# Altium schematic symbol library Electronic Devices_LIB.SchLib: 703 symbols (part 8 of 8) (continued)
## TRANS_BIPOLAR_NPN_BC847BDW1T1G (continued)
ON Semi BC847BDW1T1G Dual NPN Bipolar Transistor; 0.1 A; 45 V; 6-Pin SC-88; Manufacturer: ON Semiconductor; Max Power Dissipation: 380mW; Max Collector Current: 100mA; Collector Base Voltage (VCBO): 50V; Transition Frequency: 100MHz; Collector Emitter Breakdown Voltage: 45V; Collector-emitter Voltage-Max: 600mV; hFE Min: 200; Emitter Base Voltage (VEBO): 6V; Number of Elements: 2; Supplier 1: Digikey; Manufacturer Part Number: BC847BDW1T1G; RoHS: Yes; Category: BJTs; Stock 1: 35041; Pricing 1: 1=0.22, 10=0.149, 100=0.0729, 500=0.06078, 1000=0.04224 (USD); Case/Package: SOT-363-6; Number of Pins: 6; Contact Plating: Tin,Matte; Min Operating Temperature: -55°C; Max Operating Temperature: 150°C; Package Quantity: 3000; Packaging: Tape and Reel; Max Breakdown Voltage: 45V; Polarity: NPN; Series: -; Collector Emitter Voltage (VCEO): 45V; Collector Emitter Saturation Voltage: 600mV; Power Dissipation: 380mW; Max Frequency: 100MHz; Gain Bandwidth Product: 100MHz; Frequency: 100MHz; Voltage Rating (DC): 45V; Current Rating: 100mA; Length: 2mm; Width: 1.25mm; Height: 0.9mm; Radiation Hardening: No; RoHS Compliant: Yes; Lead Free: Lead Free; Halogen Free: Halogen Free; Reach SVHC Compliant: No; ComponentLink1URL: https://datasheet.ciiva.com/15138/getdatasheetpartid-32925-15138586.pdf?src-supplier=Verical; ComponentLink1Description: https://datasheet.ciiva.com/15138/getdatasheetpartid-32925-15138586.pdf?src-supplier=Verical; ComponentLink2URL: https://datasheet.ciiva.com/34303/2012187-34303831.pdf?src-supplier=Jameco; ComponentLink2Description: https://datasheet.ciiva.com/34303/2012187-34303831.pdf?src-supplier=Jameco; ComponentLink3URL: https://datasheet.ciiva.com/968/bc846bdw1t1-d-968805.pdf?src-supplier=Digikey; ComponentLink3Description: https://datasheet.ciiva.com/968/bc846bdw1t1-d-968805.pdf?src-supplier=Digikey; ComponentLink4URL: https://datasheet.ciiva.com/968/bc846bdw1t1-d-968806.pdf?src-supplier=Digikey; ComponentLink4Description: https://datasheet.ciiva.com/968/bc846bdw1t1-d-968806.pdf?src-supplier=Digikey; ComponentLink5URL: https://datasheet.ciiva.com/968/bc846bdw1t1-d-968807.pdf?src-supplier=Digikey; ComponentLink5Description: https://datasheet.ciiva.com/968/bc846bdw1t1-d-968807.pdf?src-supplier=Digikey; ComponentLink6URL: https://datasheet.ciiva.com/1215/bc846bdw1t1-d-1215105.pdf?src-supplier=Farnell; ComponentLink6Description: https://datasheet.ciiva.com/1215/bc846bdw1t1-d-1215105.pdf?src-supplier=Farnell; ComponentLink7URL: https://datasheet.ciiva.com/22653/1708249-22653900.pdf?src-supplier=Element14; ComponentLink7Description: https://datasheet.ciiva.com/22653/1708249-22653900.pdf?src-supplier=Element14; ComponentLink8URL: https://datasheet.ciiva.com/16201/bc846bdw1t1-d-16201675.pdf?src-supplier=Future+Electronics; ComponentLink8Description: https://datasheet.ciiva.com/16201/bc846bdw1t1-d-16201675.pdf?src-supplier=Future+Electronics; Supplier Part Number 1: BC847BDW1T1GOSCT-ND
footprint TRANS_BJT_SOT65P210X110-6N
part A pins: 3 COLLECTOR_1, 4 EMITTER_1, 5 BASE_1
part B pins: 1 EMITTER_2, 2 BASE_2, 6 COLLECTOR_2

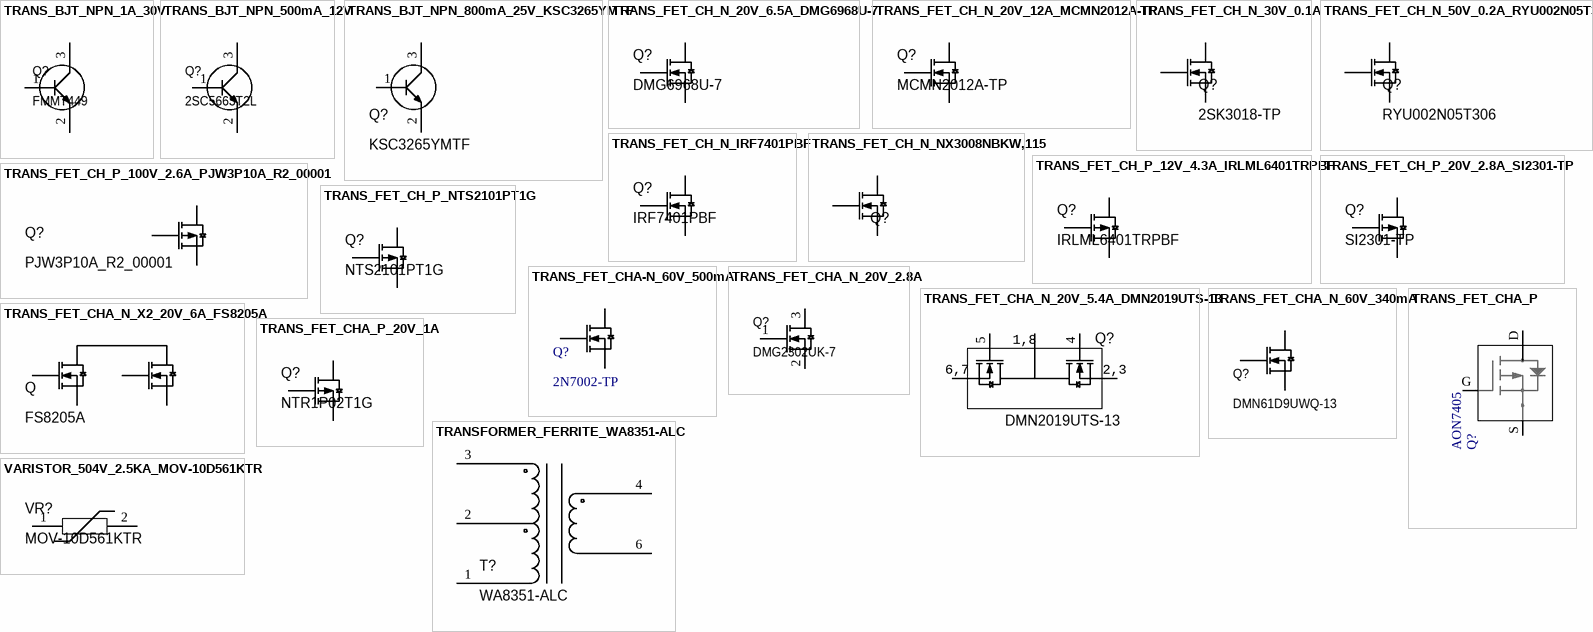
[diagram p36: symbols TRANS_BJT_NPN_1A_30V to VARISTOR_504V_2.5KA_MOV-10D561KTR]

## TRANS_BJT_NPN_1A_30V
designator Q?, comment FMMT449
FMMT Series NPN 500 mW 30 V 1 A Surface Mount Small Signal Transistor - SOT-23; Manufacturer: ON Semiconductor / Fairchild; Max Power Dissipation: 500mW; Max Collector Current: 1A; Collector Base Voltage (VCBO): 50V; Transition Frequency: 150MHz; Collector Emitter Breakdown Voltage: 30V; Emitter Base Voltage (VEBO): 5V; Collector-emitter Voltage-Max: 1V; Number of Elements: 1; hFE Min: 100; Supplier 1: Avnet; Manufacturer Part Number: FMMT449; RoHS: Yes; Category: Uncategorized; Stock 1: 12000; Pricing 1: 4007=0.09235, 4100=0.08986, 8100=0.08736, 21000=0.08486, 41000=0.08237, 210000=0.07987, 410000=0.07738 (USD); Mount: Surface Mount; Case/Package: SOT-323; Number of Pins: 3; Weight: 0.03g; Min Operating Temperature: -55°C; Max Operating Temperature: 150°C; Packaging: Tape and Reel; Package Quantity: 3000; Series: -; Current Rating: 1A; Voltage Rating (DC): 30V; Collector Emitter Voltage (VCEO): 30V; Max Breakdown Voltage: 30V; Polarity: NPN; Gain Bandwidth Product: 150MHz; Max Frequency: 150MHz; Frequency: 150MHz; Collector Emitter Saturation Voltage: 1V; Power Dissipation: 500mW; Length: 2.92mm; Width: 1.4mm; Height: 0.94mm; Radiation Hardening: No; RoHS Compliant: Yes; Lead Free: Lead Free; ComponentLink1URL: https://datasheet.ciiva.com/4722/fmmt449-111706-4722204.pdf?src-supplier=Mouser; ComponentLink1Description: https://datasheet.ciiva.com/4722/fmmt449-111706-4722204.pdf?src-supplier=Mouser; ComponentLink2URL: https://datasheet.ciiva.com/6360/fmmt449-6360756.pdf?src-supplier=Digi-Key; ComponentLink2Description: https://datasheet.ciiva.com/6360/fmmt449-6360756.pdf?src-supplier=Digi-Key; ComponentLink3URL: https://datasheet.ciiva.com/6360/fmmt449-6360759.pdf?src-supplier=Digi-Key; ComponentLink3Description: https://datasheet.ciiva.com/6360/fmmt449-6360759.pdf?src-supplier=Digi-Key; ComponentLink4URL: https://datasheet.ciiva.com/6360/fmmt449-6360760.pdf?src-supplier=Digi-Key; ComponentLink4Description: https://datasheet.ciiva.com/6360/fmmt449-6360760.pdf?src-supplier=Digi-Key; Supplier Part Number 1: FMMT449
footprint SOT_23_3_MMBT2907A-13 (SOT-23-3)
pins: 1 B, 2 E, 3 C

## TRANS_BJT_NPN_500mA_12V
designator Q?, comment 2SC5663T2L
2SC5663 Series 12 V 0.5 A SMT NPN Low Frequency Transistor - VMT-3; Manufacturer: Rohm; Collector Emitter Voltage (VCEO): 12V; Max Power Dissipation: 150mW; hFE Min: 270; Max Collector Current: 500mA; Transition Frequency: 320MHz; Collector Base Voltage (VCBO): 15V; Emitter Base Voltage (VEBO): 6V; Collector Emitter Saturation Voltage: 90mV; Collector-emitter Voltage-Max: 250mV; Supplier 1: Digi-Key; Manufacturer Part Number: 2SC5663T2L; RoHS: Yes; Category: BJTs; Stock 1: 46680; Pricing 1: 1=0.53, 10=0.43, 100=0.2929, 500=0.21964, 1000=0.16474, 2000=0.15101 (USD); Mount: Surface Mount; Case/Package: SOT-723; Number of Pins: 3; Contact Plating: Copper,Tin; Min Operating Temperature: -55°C; Max Operating Temperature: 150°C; Package Quantity: 1; Packaging: Tape and Reel; Collector Emitter Breakdown Voltage: 12V; Polarity: NPN; Continuous Collector Current: 500mA; Max Breakdown Voltage: 12V; Gain Bandwidth Product: 320MHz; Voltage Rating (DC): 12V; Power Dissipation: 150mW; Current Rating: 500mA; Series: -; Radiation Hardening: No; Reach SVHC Compliant: No; Lead Free: Lead Free; RoHS Compliant: Yes; ComponentLink1URL: https://datasheet.ciiva.com/6361/2sc5585-6361793.pdf?src-supplier=Digi-Key; ComponentLink1Description: https://datasheet.ciiva.com/6361/2sc5585-6361793.pdf?src-supplier=Digi-Key; ComponentLink2URL: https://datasheet.ciiva.com/16307/2sc5585-16307766.pdf?src-supplier=Future+Electronics; ComponentLink2Description: https://datasheet.ciiva.com/16307/2sc5585-16307766.pdf?src-supplier=Future+Electronics; ComponentLink3URL: https://datasheet.ciiva.com/1194/1641603-1194870.pdf?src-supplier=Element14; ComponentLink3Description: https://datasheet.ciiva.com/1194/1641603-1194870.pdf?src-supplier=Element14; Supplier Part Number 1: 2SC5663T2LCT-ND; Supplier 2: Digi-Key; Supplier Part Number 2: 311-261HRCT-ND
footprint TRANS_BJT_2SC5663T2L (SOT-723)
pins: 1 B, 2 E, 3 C

## TRANS_BJT_NPN_800mA_25V_KSC3265YMTF
designator Q?, comment KSC3265YMTF
KSC3265 Series 25 V CE Breakdown .8 A NPN Epitaxial Silicon Transistor - SOT-23; Manufacturer: ON Semiconductor / Fairchild; Max Power Dissipation: 200mW; hFE Min: 100; Max Collector Current: 800mA; Collector Base Voltage (VCBO): 30V; Emitter Base Voltage (VEBO): 5V; Gain Bandwidth Product: 120MHz; Collector-emitter Voltage-Max: 400mV; Collector Emitter Voltage (VCEO): 25V; Number of Elements: 1; Supplier 1: Digikey; Manufacturer Part Number: KSC3265YMTF; RoHS: Yes; Category: BJTs; Stock 1: 8859; Pricing 1: 1=0.22, 10=0.132, 100=0.0817, 500=0.05974, 1000=0.0526, 3000=0.0435, 6000=0.0389, 9000=0.03655, 15000=0.0339, 21000=0.03233, 30000=0.0308, 75000=0.02745, 150000=0.02537, 300000=0.02363 (USD); Mount: Surface Mount; Case/Package: SOT-23; Number of Pins: 3; Weight: 0.03g; Min Operating Temperature: -55°C; Max Operating Temperature: 150°C; Package Quantity: 3000; Packaging: Tape and Reel; Polarity: NPN; Series: -; Frequency: 120MHz; Transition Frequency: 120MHz; Collector Emitter Breakdown Voltage: 25V; Max Breakdown Voltage: 25V; Collector Emitter Saturation Voltage: 400mV; Power Dissipation: 200mW; Max Frequency: 120MHz; Voltage Rating (DC): 25V; Current Rating: 800mA; Length: 2.9mm; Width: 1.3mm; Height: 0.97mm; Radiation Hardening: No; Reach SVHC Compliant: No; Lead Free: Lead Free; RoHS Compliant: Yes; ComponentLink1URL: https://datasheet.ciiva.com/15138/getdatasheetpartid-30747-15138569.pdf?src-supplier=Verical; ComponentLink1Description: https://datasheet.ciiva.com/15138/getdatasheetpartid-30747-15138569.pdf?src-supplier=Verical; ComponentLink2URL: https://datasheet.ciiva.com/6356/ksc3265-6356136.pdf?src-supplier=Digikey; ComponentLink2Description: https://datasheet.ciiva.com/6356/ksc3265-6356136.pdf?src-supplier=Digikey; ComponentLink3URL: https://datasheet.ciiva.com/6356/ksc3265-6356138.pdf?src-supplier=Digikey; ComponentLink3Description: https://datasheet.ciiva.com/6356/ksc3265-6356138.pdf?src-supplier=Digikey; ComponentLink4URL: https://datasheet.ciiva.com/6356/ksc3265-6356141.pdf?src-supplier=Digikey; ComponentLink4Description: https://datasheet.ciiva.com/6356/ksc3265-6356141.pdf?src-supplier=Digikey; Supplier Part Number 1: KSC3265YMTFCT-ND
footprint TRANS_BJT_SOT96P237X111-3N
pins: 1 B, 2 E, 3 C

## TRANS_FET_CH_N_20V_6.5A_DMG6968U-7
designator Q?, comment DMG6968U-7
Trans Mosfet N-ch 20V 6.5A 3-PIN SOT-23 T/r Trans Mosfet N-ch 20V 6.5A 3-PIN SOT-23 T/r; Manufacturer: Diodes; Rise Time: 66ns; Turn-Off Delay Time: 613ns; Turn-On Delay Time: 54ns; Fall Time: 205ns; Gate to Source Voltage (Vgs): 12V; Polarity: N-CHANNEL; Nominal Vgs: 500mV; Input Capacitance: 151pF; Max Power Dissipation: 1.3W; Rds On Max: 25mR; Number of Channels: 1; Drain-source On Resistance-Max: 36mR; Supplier 1: Digikey; Manufacturer Part Number: DMG6968U-7; RoHS: Yes; Category: MOSFETs; Stock 1: 575891; Pricing 1: 1=0.37, 10=0.289, 100=0.1732, 500=0.16034, 1000=0.10903 (USD); Mount: Surface Mount; Case/Package: SOT-23-3; Number of Pins: 3; Weight: 0.000282oz; Min Operating Temperature: -55°C; Max Operating Temperature: 150°C; Packaging: Tape and Reel; Package Quantity: 1; Continuous Drain Current (ID): 6.5A; Series: -; Drain to Source Voltage (Vdss): 20V; Drain to Source Resistance: 25mR; Threshold Voltage: 500mV; Length: 2.9mm; Width: 1.3mm; Height: 1mm; Radiation Hardening: No; Reach SVHC Compliant: No; Lead Free: Lead Free; RoHS Compliant: Yes; ComponentLink1URL: https://datasheet.ciiva.com/5774/ds31738-5774992.pdf?src-supplier=Farnell; ComponentLink1Description: https://datasheet.ciiva.com/5774/ds31738-5774992.pdf?src-supplier=Farnell; ComponentLink2URL: https://datasheet.ciiva.com/22712/1915638-22712395.pdf?src-supplier=Element14; ComponentLink2Description: https://datasheet.ciiva.com/22712/1915638-22712395.pdf?src-supplier=Element14; Supplier Part Number 1: DMG6968UDICT-ND
footprint SOT_23_3_MMBT2907A-13 (SOT-23-3)
pins: 1 G, 2 S, 3 D

## TRANS_FET_CH_N_20V_12A_MCMN2012A-TP
designator Q?, comment MCMN2012A-TP
N-channel Mosfet; Manufacturer: MCC; Supplier 1: Digikey; Manufacturer Part Number: MCMN2012A-TP; RoHS: No; Category: Uncategorized; Stock 1: 17562; Pricing 1: 1=0.44, 10=0.378, 100=0.2626, 500=0.20504, 1000=0.16665 (USD); Supplier Part Number 1: 353-MCMN2012A-TPDKR-ND
footprint TRANS_FET_DFN2020-6JA (DFN2020)
pins: D, G, S

## TRANS_FET_CH_N_30V_0.1A
designator Q?, comment 2SK3018-TP
Trans Mosfet N-ch 30V 0.1A 3-PIN SOT-323 T/r; Manufacturer: MCC; Continuous Drain Current (ID): 100mA; Rds On Max: 8R; Input Capacitance: 13pF; Max Power Dissipation: 200mW; Supplier 1: Digi-Key; Manufacturer Part Number: 2SK3018-TP; RoHS: Yes; Stock 1: 57538; Pricing 1: 1=0.41, 10=0.289, 100=0.1458, 500=0.11898, 1000=0.08827 (USD); Mount: Surface Mount; Case/Package: SOT-323; Min Operating Temperature: -55°C; Max Operating Temperature: 150°C; Packaging: Cut Tape; Drain to Source Voltage (Vdss): 30V; Series: -; RoHS Compliant: Yes; ComponentLink1URL: http://www.mccsemi.com/up_pdf/2SK3018(SOT-323).pdf?src-supplier=Digi-Key; ComponentLink1Description: http://www.mccsemi.com/up_pdf/2SK3018(SOT-323).pdf?src-supplier=Digi-Key; Supplier Part Number 1: 2SK3018-TPMSCT-ND
footprint SOT-323 (SC-70, SOT-323)
pins: D, G, S

## TRANS_FET_CH_N_50V_0.2A_RYU002N05T306
designator Q?, comment RYU002N05T306
Trans MOSFET N-CH Si 50V 0.2A 3-Pin UMT T/R; Manufacturer: Rohm; Continuous Drain Current (ID): 200mA; Supplier 1: Verical; Manufacturer Part Number: RYU002N05T306; RoHS: Yes; Category: MOSFETs; Stock 1: 3000; Pricing 1: 705=0.1073, 1000=0.1038, 2500=0.1007 (USD); Drain to Source Voltage (Vdss): 50V; Lead Free: Lead Free; RoHS Compliant: Yes; Supplier Part Number 1: RYU002N05T306
footprint SOT-323 (SC-70, SOT-323)
pins: D, G, S

## TRANS_FET_CH_N_IRF7401PBF
designator Q?, comment IRF7401PBF
IRF7401PBF N-channel MOSFET Transistor; 8.7 A; 20 V; 8-Pin SOIC; Manufacturer: International Rectifier; Continuous Drain Current (ID): 8.7A; Max Power Dissipation: 2.5W; Drain to Source Voltage (Vdss): 20V; Gate to Source Voltage (Vgs): 12V; Turn-Off Delay Time: 65ns; Turn-On Delay Time: 13ns; Input Capacitance: 1.6nF; Rise Time: 72ns; Number of Elements: 1; Fall Time: 92ns; Threshold Voltage: 700mV; Drain-source On Resistance-Max: 22mR; Supplier 1: Digikey; Manufacturer Part Number: IRF7401PBF; RoHS: Yes; Category: Uncategorized; Mount: Surface Mount; Case/Package: SOIC; Number of Pins: 8; Min Operating Temperature: -55°C; Max Operating Temperature: 150°C; Power Dissipation: 2.5W; Voltage Rating (DC): 20V; Current Rating: 8.7A; Length: 5mm; Width: 4mm; Height: 1.5mm; Lead Free: Lead Free; RoHS Compliant: Yes; Reach SVHC Compliant: No; ComponentLink1URL: https://datasheet.ciiva.com/6368/irf7401pbf-6368096.pdf?src-supplier=Digikey; ComponentLink1Description: https://datasheet.ciiva.com/6368/irf7401pbf-6368096.pdf?src-supplier=Digikey; ComponentLink2URL: https://datasheet.ciiva.com/19479/1560843-19479950.pdf?src-supplier=Jameco; ComponentLink2Description: https://datasheet.ciiva.com/19479/1560843-19479950.pdf?src-supplier=Jameco; ComponentLink3URL: https://datasheet.ciiva.com/7935/irf7401pbf-7935735.pdf?src-supplier=Element14; ComponentLink3Description: https://datasheet.ciiva.com/7935/irf7401pbf-7935735.pdf?src-supplier=Element14; ComponentLink4URL: https://datasheet.ciiva.com/16379/irf7401pbf-16379769.pdf?src-supplier=Future+Electronics; ComponentLink4Description: https://datasheet.ciiva.com/16379/irf7401pbf-16379769.pdf?src-supplier=Future+Electronics; Supplier Part Number 1: 2156-IRF7401PBF-ND
footprint FET_IRF_SOIC127P600X175-8N
simulation model irf7401 (Model Description)
pins: D, G, S

## TRANS_FET_CH_N_NX3008NBKW,115
designator Q?, comment NX3008NBKW,115  (value not drawn)
Trans MOSFET N-CH 30V 0.35A Automotive 3-Pin SC-70 T/R; Manufacturer: Nexperia; Rise Time: 11ns; Turn-Off Delay Time: 69ns; Turn-On Delay Time: 15ns; Supplier 1: Digikey; Manufacturer Part Number: NX3008NBKW,115; RoHS: Yes; Category: MOSFETs; Stock 1: 784274; Pricing 1: 1=0.35, 10=0.239, 100=0.1169, 500=0.09748, 1000=0.06774 (USD); RoHS Compliant: Yes; ComponentLink1URL: https://www.mouser.com/ds/2/302/NX3008NBKW-1151440.pdf?src-supplier=Mouser; ComponentLink1Description: https://www.mouser.com/ds/2/302/NX3008NBKW-1151440.pdf?src-supplier=Mouser; ComponentLink2URL: http://www.farnell.com/datasheets/1508392.pdf?src-supplier=Farnell; ComponentLink2Description: http://www.farnell.com/datasheets/1508392.pdf?src-supplier=Farnell; ComponentLink3URL: https://assets.nexperia.com/documents/data-sheet/NX3008NBKW.pdf?src-supplier=Digikey; ComponentLink3Description: https://assets.nexperia.com/documents/data-sheet/NX3008NBKW.pdf?src-supplier=Digikey; ComponentLink4URL: https://datasheet.octopart.com/NX3008NBKW%2C115-Nexperia-datasheet-87581391.pdf?src-supplier=LKR; ComponentLink4Description: https://datasheet.octopart.com/NX3008NBKW%2C115-Nexperia-datasheet-87581391.pdf?src-supplier=LKR; ComponentLink5URL: https://datasheet.octopart.com/NX3008NBKW%2C115-Nexperia-datasheet-154583516.pdf?src-supplier=TME; ComponentLink5Description: https://datasheet.octopart.com/NX3008NBKW%2C115-Nexperia-datasheet-154583516.pdf?src-supplier=TME; Supplier Part Number 1: 1727-1280-1-ND
footprint TRANS_FET_SOT65P210X110-3N (SC-70, SOT-323)
pins: D, G, S

## TRANS_FET_CH_P_12V_4.3A_IRLML6401TRPBF
designator Q?, comment IRLML6401TRPBF
Mosfet, Power; P-ch; Vdss -12V; Rds(on) 0.05 Ohm; Id -4.3A; MICRO3; Pd 1.3W; Vgs +/-8V; Manufacturer: Infineon; Continuous Drain Current (ID): 4.3A; Input Capacitance: 830pF; Rds On Max: 50mR; Nominal Vgs: -550mV; Number of Channels: 1; Fall Time: 210ns; Supplier 1: Mouser; Manufacturer Part Number: IRLML6401TRPBF; RoHS: Yes; Category: MOSFETs; Stock 1: 257081; Pricing 1: 1=0.47, 10=0.259, 50=0.259, 100=0.161, 1000=0.144, 10000=0.088 (USD); Mount: Surface Mount; Case/Package: SOT-23; Number of Pins: 3; Min Operating Temperature: -55°C; Max Operating Temperature: 150°C; Drain to Source Voltage (Vdss): -12V; Packaging: Cut Tape; Max Power Dissipation: 1.3W; Series: HEXFET®; Dual Supply Voltage: -12V; Threshold Voltage: -550mV; Max Dual Supply Voltage: -12V; Current Rating: -4.3A; Package Quantity: 3000; Resistance: 50mR; Voltage Rating (DC): -12V; Number of Elements: 1; On-State Resistance: 50mR; Termination: SMD/SMT; Radiation Hardening: No; RoHS Compliant: Yes; Lead Free: Lead Free; Reach SVHC Compliant: No; Halogen Free: Halogen Free; ComponentLink1URL: http://www.farnell.com/datasheets/1912227.pdf?src-supplier=Farnell; ComponentLink1Description: http://www.farnell.com/datasheets/1912227.pdf?src-supplier=Farnell; ComponentLink2URL: https://www.infineon.com/dgdl/irlml6401pbf.pdf?fileId=5546d462533600a401535668b96d2634&src-supplier=Digikey; ComponentLink2Description: https://www.infineon.com/dgdl/irlml6401pbf.pdf?fileId=5546d462533600a401535668b96d2634&src-supplier=Digikey; ComponentLink3URL: http://datasheet.octopart.com/IRLML6401TRPBF-International-Rectifier-datasheet-66727.pdf?src-supplier=Future+Electronics; ComponentLink3Description: http://datasheet.octopart.com/IRLML6401TRPBF-International-Rectifier-datasheet-66727.pdf?src-supplier=Future+Electronics; ComponentLink4URL: http://www.farnell.com/datasheets/1912227.pdf?src-supplier=Newark; ComponentLink4Description: http://www.farnell.com/datasheets/1912227.pdf?src-supplier=Newark; ComponentLink5URL: https://datasheet.octopart.com/IRLML6401TRPBF-Infineon-datasheet-41193306.pdf?src-supplier=Newark; ComponentLink5Description: https://datasheet.octopart.com/IRLML6401TRPBF-Infineon-datasheet-41193306.pdf?src-supplier=Newark; ComponentLink6URL: http://datasheet.octopart.com/IRLML6401TRPBF-International-Rectifier-datasheet-66727.pdf?src-supplier=Rs; ComponentLink6Description: http://datasheet.octopart.com/IRLML6401TRPBF-International-Rectifier-datasheet-66727.pdf?src-supplier=Rs; ComponentLink7URL: http://www.farnell.com/datasheets/1912227.pdf?src-supplier=Element14; ComponentLink7Description: http://www.farnell.com/datasheets/1912227.pdf?src-supplier=Element14; ComponentLink8URL: https://datasheet.octopart.com/IRLML6401TRPBF-International-Rectifier-datasheet-10898914.pdf?src-supplier=Element14; ComponentLink8Description: https://datasheet.octopart.com/IRLML6401TRPBF-International-Rectifier-datasheet-10898914.pdf?src-supplier=Element14; Supplier Part Number 1: 942-IRLML6401TRPBF
footprint TRANS_FET_CH_P_SOT95P237X125-3N
pins: 1 G, 2 S, 3 D

## TRANS_FET_CH_P_20V_2.8A_SI2301-TP
designator Q?, comment SI2301-TP
SI2301 Series 20 V 120 mOhm SMT P-Channel Field Effect Transistor - SOT-23-3; Manufacturer: MCC; Rds On Max: 120mR; Input Capacitance: 880pF; Drain to Source Voltage (Vdss): 20V; Continuous Drain Current (ID): 2.8A; Max Power Dissipation: 1.25W; Drain to Source Resistance: 110mR; Number of Elements: 1; Drain to Source Breakdown Voltage: -20V; Gate to Source Voltage (Vgs): 8V; Supplier 1: Digikey; Manufacturer Part Number: SI2301-TP; RoHS: Yes; Category: MOSFETs; Stock 1: 56093; Pricing 1: 1=0.45, 10=0.277, 100=0.175, 500=0.13082, 1000=0.11655, 3000=0.09838, 6000=0.08922, 9000=0.08454, 15000=0.07929, 21000=0.07618, 30000=0.07316, 75000=0.06652, 150000=0.06563 (USD); Mount: Surface Mount; Case/Package: SOT-23; Number of Pins: 3; Min Operating Temperature: -55°C; Max Operating Temperature: 150°C; Packaging: Tape and Reel; Power Dissipation: 1.25W; Polarity: P-CHANNEL; Drain-source On Resistance-Max: 120MR; Series: -; Lead Free: Lead Free; RoHS Compliant: Yes; ComponentLink1URL: https://datasheet.ciiva.com/6385/si2301sot-23-6385205.pdf?src-supplier=Digikey; ComponentLink1Description: https://datasheet.ciiva.com/6385/si2301sot-23-6385205.pdf?src-supplier=Digikey; ComponentLink2URL: https://datasheet.ciiva.com/6385/si2301sot-23-6385207.pdf?src-supplier=Digikey; ComponentLink2Description: https://datasheet.ciiva.com/6385/si2301sot-23-6385207.pdf?src-supplier=Digikey; ComponentLink3URL: https://datasheet.ciiva.com/6385/si2301sot-23-6385209.pdf?src-supplier=Digikey; ComponentLink3Description: https://datasheet.ciiva.com/6385/si2301sot-23-6385209.pdf?src-supplier=Digikey; ComponentLink4URL: https://datasheet.ciiva.com/17441/si2301sot-23-17441142.pdf?src-supplier=Future+Electronics; ComponentLink4Description: https://datasheet.ciiva.com/17441/si2301sot-23-17441142.pdf?src-supplier=Future+Electronics; Supplier Part Number 1: SI2301-TPMSCT-ND
footprint TRANS_FET_CH_P_SOT95P237X125-3N
pins: 1 G, 2 S, 3 D

## TRANS_FET_CH_P_100V_2.6A_PJW3P10A_R2_00001
designator Q?, comment PJW3P10A_R2_00001
PJW3P10A R2 00001 Panjit Transistor MOSFET Single 100 V 2.6A 3.1W MOSFET (Metal Oxide) Surface Mount SOT-223; Supplier 1: Digikey; Manufacturer: Pan Jit; Manufacturer Part Number: PJW3P10A_R2_00001; RoHS: Yes; Stock 1: 8837; Pricing 1: 1=0.64, 10=0.551, 100=0.3829, 500=0.29894, 1000=0.24298 (USD); RoHS Compliant: Yes; Supplier Part Number 1: 3757-PJW3P10A_R2_00001CT-ND
footprint SOT223 (SOT-223-3, TO-261-4, TO-261AA)
pins: 1 G, 2 D, 3 S

## TRANS_FET_CH_P_NTS2101PT1G
designator Q?, comment NTS2101PT1G
NTS2101PT1G P-channel MOSFET Transistor, 1.5 A, 8 V, 3-Pin SC-70 | ON Semiconductor NTS2101PT1G; Power Dissipation: 290mW; Drain to Source Resistance: 117mR; Drain to Source Voltage (Vdss): 8V; Continuous Drain Current (ID): 1.4A; Voltage Rating (DC): -8V; Current Rating: -1.4A; Rise Time: 15ns; Nominal Vgs: -700mV; Input Capacitance: 640pF; Number of Elements: 1; Rds On Max: 100mR; Turn-Off Delay Time: 26ns; Turn-On Delay Time: 6.2ns; Element Configuration: Single; Drain-source On Resistance-Max: 65MR; Supplier 1: Digikey; Manufacturer: ON Semiconductor; Manufacturer Part Number: NTS2101PT1G; RoHS: Yes; Category: MOSFETs; Stock 1: 9056; Pricing 1: 1=0.4, 10=0.267, 100=0.1802, 500=0.1399, 1000=0.12649 (USD); Case/Package: SOT-323-3; Number of Pins: 3; Min Operating Temperature: -55°C; Max Operating Temperature: 150°C; Packaging: Tape and Reel; Gate to Source Voltage (Vgs): 8V; Package Quantity: 1; Max Power Dissipation: 290mW; Fall Time: 15ns; Threshold Voltage: -700mV; Drain to Source Breakdown Voltage: -8V; Polarity: P-CHANNEL; Series: -; Length: 2.2mm; Width: 1.35mm; Height: 0.9mm; Radiation Hardening: No; Reach SVHC Compliant: No; Lead Free: Lead Free; RoHS Compliant: Yes; ComponentLink1URL: https://datasheet.ciiva.com/936/nts2101p-d-936860.pdf?src-supplier=Digikey; ComponentLink1Description: https://datasheet.ciiva.com/936/nts2101p-d-936860.pdf?src-supplier=Digikey; ComponentLink2URL: https://datasheet.ciiva.com/8059/85967-8059414.pdf?src-supplier=Element14; ComponentLink2Description: https://datasheet.ciiva.com/8059/85967-8059414.pdf?src-supplier=Element14; ComponentLink3URL: https://datasheet.ciiva.com/30480/0900766b81206071-30480248.pdf?src-supplier=Rs; ComponentLink3Description: https://datasheet.ciiva.com/30480/0900766b81206071-30480248.pdf?src-supplier=Rs; ComponentLink4URL: https://datasheet.ciiva.com/936/nts2101p-d-936861.pdf?src-supplier=Digikey; ComponentLink4Description: https://datasheet.ciiva.com/936/nts2101p-d-936861.pdf?src-supplier=Digikey; ComponentLink5URL: https://datasheet.ciiva.com/936/nts2101p-d-936862.pdf?src-supplier=Digikey; ComponentLink5Description: https://datasheet.ciiva.com/936/nts2101p-d-936862.pdf?src-supplier=Digikey; ComponentLink6URL: https://datasheet.ciiva.com/8114/nts2101p-d-8114949.pdf?src-supplier=Avnet; ComponentLink6Description: https://datasheet.ciiva.com/8114/nts2101p-d-8114949.pdf?src-supplier=Avnet; Supplier Part Number 1: NTS2101PT1GOSDKR-ND
footprint TRANS_FET_SOT65P220X100-3N
pins: 1 G, 2 D, 3 S

## TRANS_FET_CHA-N_60V_500mA
designator Q?, comment 2N7002-TP
2N7002 Series N-Channel 60 V 7.5 Ohm Surface Mount MosFet - SOT-23-3; Manufacturer: MCC; Rds On Max: 7.5R; Input Capacitance: 50pF; Continuous Drain Current (ID): 115mA; Max Power Dissipation: 200mW; Drain to Source Breakdown Voltage: 60V; Number of Elements: 1; Threshold Voltage: 1V; Element Configuration: Single; Gate to Source Voltage (Vgs): 20V; Manufacturer Part Number: 2N7002-TP; RoHS: Yes; Category: MOSFETs; Stock 1: 102856; Pricing 1: 1=0.20000, 10=0.18100, 100=0.09870, 500=0.06072, 1000=0.04140 (USD); Mount: Surface Mount; Case/Package: SOT-23; Number of Pins: 3; Min Operating Temperature: -55°C; Max Operating Temperature: 150°C; Package Quantity: 1; Packaging: Tape and Reel; Drain to Source Resistance: 7.5R; Polarity: N-CHANNEL; Series: -; Drain-source On Resistance-Max: 7.5R; Lead Free: Lead Free; RoHS Compliant: Yes; ComponentLink1URL: https://datasheet.ciiva.com/4443/2n7002sot-23-25109-4443294.pdf?src-supplier=Mouser; ComponentLink1Description: https://datasheet.ciiva.com/4443/2n7002sot-23-25109-4443294.pdf?src-supplier=Mouser; ComponentLink2URL: https://datasheet.ciiva.com/6367/2n7002sot-23-6367425.pdf?src-supplier=Digi-Key; ComponentLink2Description: https://datasheet.ciiva.com/6367/2n7002sot-23-6367425.pdf?src-supplier=Digi-Key; ComponentLink3URL: https://datasheet.ciiva.com/6367/2n7002sot-23-6367421.pdf?src-supplier=Digi-Key; ComponentLink3Description: https://datasheet.ciiva.com/6367/2n7002sot-23-6367421.pdf?src-supplier=Digi-Key; ComponentLink4URL: https://datasheet.ciiva.com/6367/2n7002sot-23-6367423.pdf?src-supplier=Digi-Key; ComponentLink4Description: https://datasheet.ciiva.com/6367/2n7002sot-23-6367423.pdf?src-supplier=Digi-Key; ComponentLink5URL: https://datasheet.ciiva.com/17040/2n7002sot-23-17040046.pdf?src-supplier=Future+Electronics; ComponentLink5Description: https://datasheet.ciiva.com/17040/2n7002sot-23-17040046.pdf?src-supplier=Future+Electronics; Supplier 1: Digi-Key; Supplier 2: Mouser; Supplier 3: Arrow Electronics; Supplier Part Number 1: 2N7002-TPMSCT-ND; Supplier Part Number 2: 833-2N7002-TP; Supplier Part Number 3: 2N7002-TP; Power Dissipation: 200mW; Drain to Source Voltage (Vdss): 60V
footprint TRANS_SOT-23-N_FET (SOT-23 FET Normal Density)
pins: D, G, S

## TRANS_FET_CHA_N_20V_2.8A
designator Q?, comment DMG2302UK-7
MOSFET N-CH 20V 2.8A SOT23; Manufacturer: Diodes; Max Power Dissipation: 660mW; Rds On Max: 90mR; Input Capacitance: 130pF; Supplier 1: Digi-Key; Manufacturer Part Number: DMG2302UK-7; RoHS: Yes; Category: MOSFETs; Stock 1: 269943; Pricing 1: 1=0.34, 10=0.254, 100=0.1436, 500=0.0951, 1000=0.07291 (USD); Mount: Surface Mount; Case/Package: TO-236-3; Min Operating Temperature: -55°C; Max Operating Temperature: 150°C; Packaging: Cut Tape; Series: Automotive, AEC-Q101; Drain to Source Voltage (Vdss): 20V; Continuous Drain Current (ID): 2.8A; RoHS Compliant: Yes; ComponentLink1URL: http://www.farnell.com/datasheets/2814387.pdf?src-supplier=Farnell; ComponentLink1Description: http://www.farnell.com/datasheets/2814387.pdf?src-supplier=Farnell; ComponentLink2URL: http://www.farnell.com/datasheets/2814387.pdf?src-supplier=Newark; ComponentLink2Description: http://www.farnell.com/datasheets/2814387.pdf?src-supplier=Newark; ComponentLink3URL: https://www.diodes.com/assets/Datasheets/DMG2302UK.pdf?src-supplier=Digi-Key; ComponentLink3Description: https://www.diodes.com/assets/Datasheets/DMG2302UK.pdf?src-supplier=Digi-Key; ComponentLink4URL: http://www.farnell.com/datasheets/2814387.pdf?src-supplier=Element14; ComponentLink4Description: http://www.farnell.com/datasheets/2814387.pdf?src-supplier=Element14; Supplier Part Number 1: DMG2302UK-7DIDKR-ND
footprint SOT_23_3_MMBT2907A-13 (SOT-23-3)
pins: 1 G, 2 S, 3 D

## TRANS_FET_CHA_N_20V_5.4A_DMN2019UTS-13
designator Q?, comment DMN2019UTS-13
MOSFET 2N-CH 20V 5.4A TSSOP-8; Manufacturer: Diodes; Rds On Max: 18.5mR; Input Capacitance: 143pF; Rise Time: 78ns; Max Power Dissipation: 780mW; Turn-On Delay Time: 53ns; Turn-Off Delay Time: 562ns; Fall Time: 234ns; Gate to Source Voltage (Vgs): 12V; Number of Channels: 2; Drain to Source Resistance: 24mR; FET Type: 2 N-Channel; Polarity: N-CHANNEL; Supplier 1: Digi-Key; Manufacturer Part Number: DMN2019UTS-13; RoHS: Yes; Category: MOSFETs; Stock 1: 21108; Pricing 1: 1=0.4, 10=0.341, 100=0.2371, 500=0.18514, 1000=0.15048 (USD); Mount: Surface Mount; Case/Package: TSSOP; Number of Pins: 8; Weight: 0.005573oz; Min Operating Temperature: -55°C; Max Operating Temperature: 150°C; Package Quantity: 2500; Packaging: Tape and Reel; Drain to Source Voltage (Vdss): 20V; Continuous Drain Current (ID): 5.4A; Series: -; Drain-source On Resistance-Max: 18.5mR; Lead Free: Lead Free; Reach SVHC Compliant: Yes; RoHS Compliant: Yes; ComponentLink1URL: https://datasheet.ciiva.com/26993/dmn2019uts-26993376.pdf?src-supplier=Future+Electronics; ComponentLink1Description: https://datasheet.ciiva.com/26993/dmn2019uts-26993376.pdf?src-supplier=Future+Electronics; ComponentLink2URL: https://datasheet.ciiva.com/930/dmn2019uts-930438.pdf?src-supplier=Digi-Key; ComponentLink2Description: https://datasheet.ciiva.com/930/dmn2019uts-930438.pdf?src-supplier=Digi-Key; ComponentLink3URL: https://datasheet.ciiva.com/6384/dmn2019uts-6384535.pdf?src-supplier=Digi-Key; ComponentLink3Description: https://datasheet.ciiva.com/6384/dmn2019uts-6384535.pdf?src-supplier=Digi-Key; Supplier Part Number 1: DMN2019UTS-13DIDKR-ND
footprint SOP65P640X120-8N
pins: 1 1/8, 2 2/3, 3 2,3, 4, 5, 6, 7 6,7, 8 1,8

## TRANS_FET_CHA_N_60V_340mA
designator Q?, comment DMN61D9UWQ-13
N-Channel Enhancement Mode MOSFET 60V 340mA 3-Pin SOT-323 T/R; Manufacturer: Diodes; Continuous Drain Current (ID): 400mA; Rds On Max: 2R; Input Capacitance: 28.5pF; Max Power Dissipation: 440mW; Supplier 1: Digi-Key; Manufacturer Part Number: DMN61D9UWQ-13; RoHS: Yes; Category: MOSFETs; Stock 1: 209235; Pricing 1: 1=0.35, 10=0.259, 100=0.1468, 500=0.0972, 1000=0.07452, 2000=0.0648, 5000=0.05832 (USD); Mount: Surface Mount; Case/Package: SOT-323; Min Operating Temperature: -55°C; Max Operating Temperature: 150°C; Packaging: Cut Tape; Drain to Source Voltage (Vdss): 60V; Series: -; RoHS Compliant: Yes; ComponentLink1URL: https://www.diodes.com/assets/Datasheets/DMN61D9UWQ.pdf?src-supplier=Digi-Key; ComponentLink1Description: https://www.diodes.com/assets/Datasheets/DMN61D9UWQ.pdf?src-supplier=Digi-Key; ComponentLink2URL: https://datasheet.octopart.com/DMN61D9UWQ-13-Diodes-Inc.-datasheet-151210411.pdf?src-supplier=Farnell; ComponentLink2Description: https://datasheet.octopart.com/DMN61D9UWQ-13-Diodes-Inc.-datasheet-151210411.pdf?src-supplier=Farnell; ComponentLink3URL: https://datasheet.octopart.com/DMN61D9UWQ-13-Diodes-Inc.-datasheet-165191130.pdf?src-supplier=Future+Electronics; ComponentLink3Description: https://datasheet.octopart.com/DMN61D9UWQ-13-Diodes-Inc.-datasheet-165191130.pdf?src-supplier=Future+Electronics; Supplier Part Number 1: DMN61D9UWQ-13DICT-ND
footprint SOT-323 (SC-70, SOT-323)
pins: D, G, S

## TRANS_FET_CHA_N_X2_20V_6A_FS8205A
designator Q, comment FS8205A
20V 6A 19.5mΩ@4.5V,3A 1.5W 2 N-Channel SOT-23-6 MOSFETs ROHS; Manufacturer: Tech Public; Supplier: LCSC; Manufacturer part number: FS8205A; ComponentLink1Description: Supplier; ComponentLink1URL: https://www.lcsc.com/product-detail/MOSFETs_TECH-PUBLIC-FS8205A_C2830320.html?utm_source=octopart&utm_medium=cpc&utm_campaign=FS8205A
footprint TRANS_SOT23-6_MOSFET NCH 2-6N - (SOT23, 6-Leads, Body 2.92x2.80mm, Pitch 0.95mm, IPC Medium Density)
pins: D1/D2, G1, G2, S1, S2

## TRANS_FET_CHA_P
designator Q?, comment AON7405
TRAN PMOS 30V 50A DFN3X3EP; CLASS: IC; AGILE_PN: 480-78892; MFG_NAME01: Alpha and Omega Semiconductor; CAD_APPROVED: Yes; PCB Footprint: dfn3p3x3p3_8l_ex; MFG_PN01: AON7405; ROHS: Yes; HEIGHT: 0.8MM
footprint TRANS_AON7405
pins: D, G, S

## TRANS_FET_CHA_P_20V_1A
designator Q?, comment NTR1P02T1G
NTR1P02T1G P-channel MOSFET Transistor; 1 A; 20 V; 3-Pin SOT-23; Manufacturer: ON Semiconductor; Rds On Max: 180mR; Input Capacitance: 165pF; Rise Time: 9ns; Nominal Vgs: -1.9V; Number of Elements: 1; Max Power Dissipation: 400mW; Drain to Source Voltage (Vdss): 20V; Continuous Drain Current (ID): 1A; Drain to Source Resistance: 148mR; Turn-On Delay Time: 7ns; Element Configuration: Single; Drain to Source Breakdown Voltage: -20V; Current Rating: -1A; Supplier 1: Digi-Key; Manufacturer Part Number: NTR1P02T1G; RoHS: Yes; Category: MOSFETs; Stock 1: 86165; Pricing 1: 1=0.35, 10=0.285, 100=0.1942, 500=0.14568, 1000=0.10926 (USD); Case/Package: SOT-23-3; Number of Pins: 3; Min Operating Temperature: -55°C; Max Operating Temperature: 150°C; Package Quantity: 3000; Packaging: Tape and Reel; Fall Time: 9ns; Power Dissipation: 400mW; Turn-Off Delay Time: 9ns; Threshold Voltage: -1.9V; Gate to Source Voltage (Vgs): 20V; Voltage Rating (DC): -20V; Polarity: P-CHANNEL; Series: -; Drain-source On Resistance-Max: 148MR; Length: 2.9mm; Width: 1.3mm; Height: 0.94mm; Radiation Hardening: No; Reach SVHC Compliant: No; Lead Free: Lead Free; RoHS Compliant: Yes; ComponentLink1URL: https://datasheet.ciiva.com/936/ntr1p02t1-d-936864.pdf?src-supplier=Digi-Key; ComponentLink1Description: https://datasheet.ciiva.com/936/ntr1p02t1-d-936864.pdf?src-supplier=Digi-Key; ComponentLink2URL: https://datasheet.ciiva.com/22641/1708311-22641684.pdf?src-supplier=Element14; ComponentLink2Description: https://datasheet.ciiva.com/22641/1708311-22641684.pdf?src-supplier=Element14; ComponentLink3URL: https://datasheet.ciiva.com/16386/ntr1p02t1-d-16386335.pdf?src-supplier=Future+Electronics; ComponentLink3Description: https://datasheet.ciiva.com/16386/ntr1p02t1-d-16386335.pdf?src-supplier=Future+Electronics; ComponentLink4URL: https://datasheet.ciiva.com/11168/ntr1p02t1-d-11168174.pdf?src-supplier=Avnet; ComponentLink4Description: https://datasheet.ciiva.com/11168/ntr1p02t1-d-11168174.pdf?src-supplier=Avnet; ComponentLink5URL: https://datasheet.ciiva.com/936/ntr1p02t1-d-936865.pdf?src-supplier=Digi-Key; ComponentLink5Description: https://datasheet.ciiva.com/936/ntr1p02t1-d-936865.pdf?src-supplier=Digi-Key; ComponentLink6URL: https://datasheet.ciiva.com/22641/1708311-22641686.pdf?src-supplier=Element14; ComponentLink6Description: https://datasheet.ciiva.com/22641/1708311-22641686.pdf?src-supplier=Element14; Supplier Part Number 1: NTR1P02T1GOSCT-ND
footprint FET_PCH_SOT96P237X111-3N (SOT-23-3 (TO-236))
pins: D, G, S

## TRANSFORMER_FERRITE_WA8351-ALC
designator T?, comment WA8351-ALC
Miniature Transformer, ferrite core, 10% tol, SMT, RoHS, halogen-free; Manufacturer: Coilcraft; Supplier 1: Coilcraft Direct; Manufacturer Part Number: WA8351-ALC; RoHS: Yes; Category: Inductors; Stock 1: 14; Pricing 1: 1=2.43, 100=2.06, 250=1.79, 500=1.56, 1000=1.21, 2500=1.04 (USD); RoHS Compliant: Yes; Supplier Part Number 1: WA8351-ALC
footprint TRANSFORMER_WA8351-A
pins: 1, 2, 3, 4, 6

## VARISTOR_504V_2.5KA_MOV-10D561KTR
designator VR?, comment MOV-10D561KTR
Varistor 504V 2.5KA Disc 10MM; Manufacturer: Bourns; Capacitance: 180pF; Voltage Rating (DC): 616V; Tolerance: 10%; Max Voltage Rating (DC): 460V; Number of Circuits: 1; Max Voltage Rating (AC): 350V; Energy: 70J; Clamping Voltage: 925V; Clamping Current: 25A; Varistor Voltage: 560V; Supplier 1: Digikey; Manufacturer Part Number: MOV-10D561KTR; RoHS: Yes; Category: Varistors; Stock 1: 3197; Pricing 1: 1=0.49, 10=0.369, 25=0.3328, 100=0.2299, 250=0.1936 (USD); Mount: Radial,Through Hole; Case/Package: Radial; Min Operating Temperature: -40°C; Max Operating Temperature: 85°C; Package Quantity: 500; Packaging: Tape and Reel; Max Surge Current: 2.5kA; Min Varistor Voltage: 504V; Max Varistor Voltage: 616V; Series: -; Diameter: 10mm; Width: 7.2mm; Radiation Hardening: No; RoHS Compliant: Yes; ComponentLink1URL: https://datasheet.ciiva.com/369/mov10d-369333.pdf?src-supplier=Digikey; ComponentLink1Description: https://datasheet.ciiva.com/369/mov10d-369333.pdf?src-supplier=Digikey; ComponentLink2URL: https://datasheet.ciiva.com/29658/mov10d-29658410.pdf?src-supplier=Digikey; ComponentLink2Description: https://datasheet.ciiva.com/29658/mov10d-29658410.pdf?src-supplier=Digikey; ComponentLink3URL: https://datasheet.ciiva.com/4541/mov10d-4541869.pdf?src-supplier=Mouser; ComponentLink3Description: https://datasheet.ciiva.com/4541/mov10d-4541869.pdf?src-supplier=Mouser; ComponentLink4URL: https://datasheet.ciiva.com/3026/mov10d-3026316.pdf?src-supplier=Avnet; ComponentLink4Description: https://datasheet.ciiva.com/3026/mov10d-3026316.pdf?src-supplier=Avnet; Supplier Part Number 1: 118-MOV-10D561KTRCT-ND
footprint VARISTOR_MOV10D561KTR
pins: 1, 2